# Altium footprint library Zmod.PcbLib: 229 footprints (part 9 of 15)
Each footprint in its own frame and in the unit in brackets; x right, y up, seen from the top. Pads: shape width x height; smd on the part's side, far side on the other; paste and mask are expansions set on the pad; w line width, h text height; cw(c..) or ccw(c..) is an arc to the next point about the centre after c.
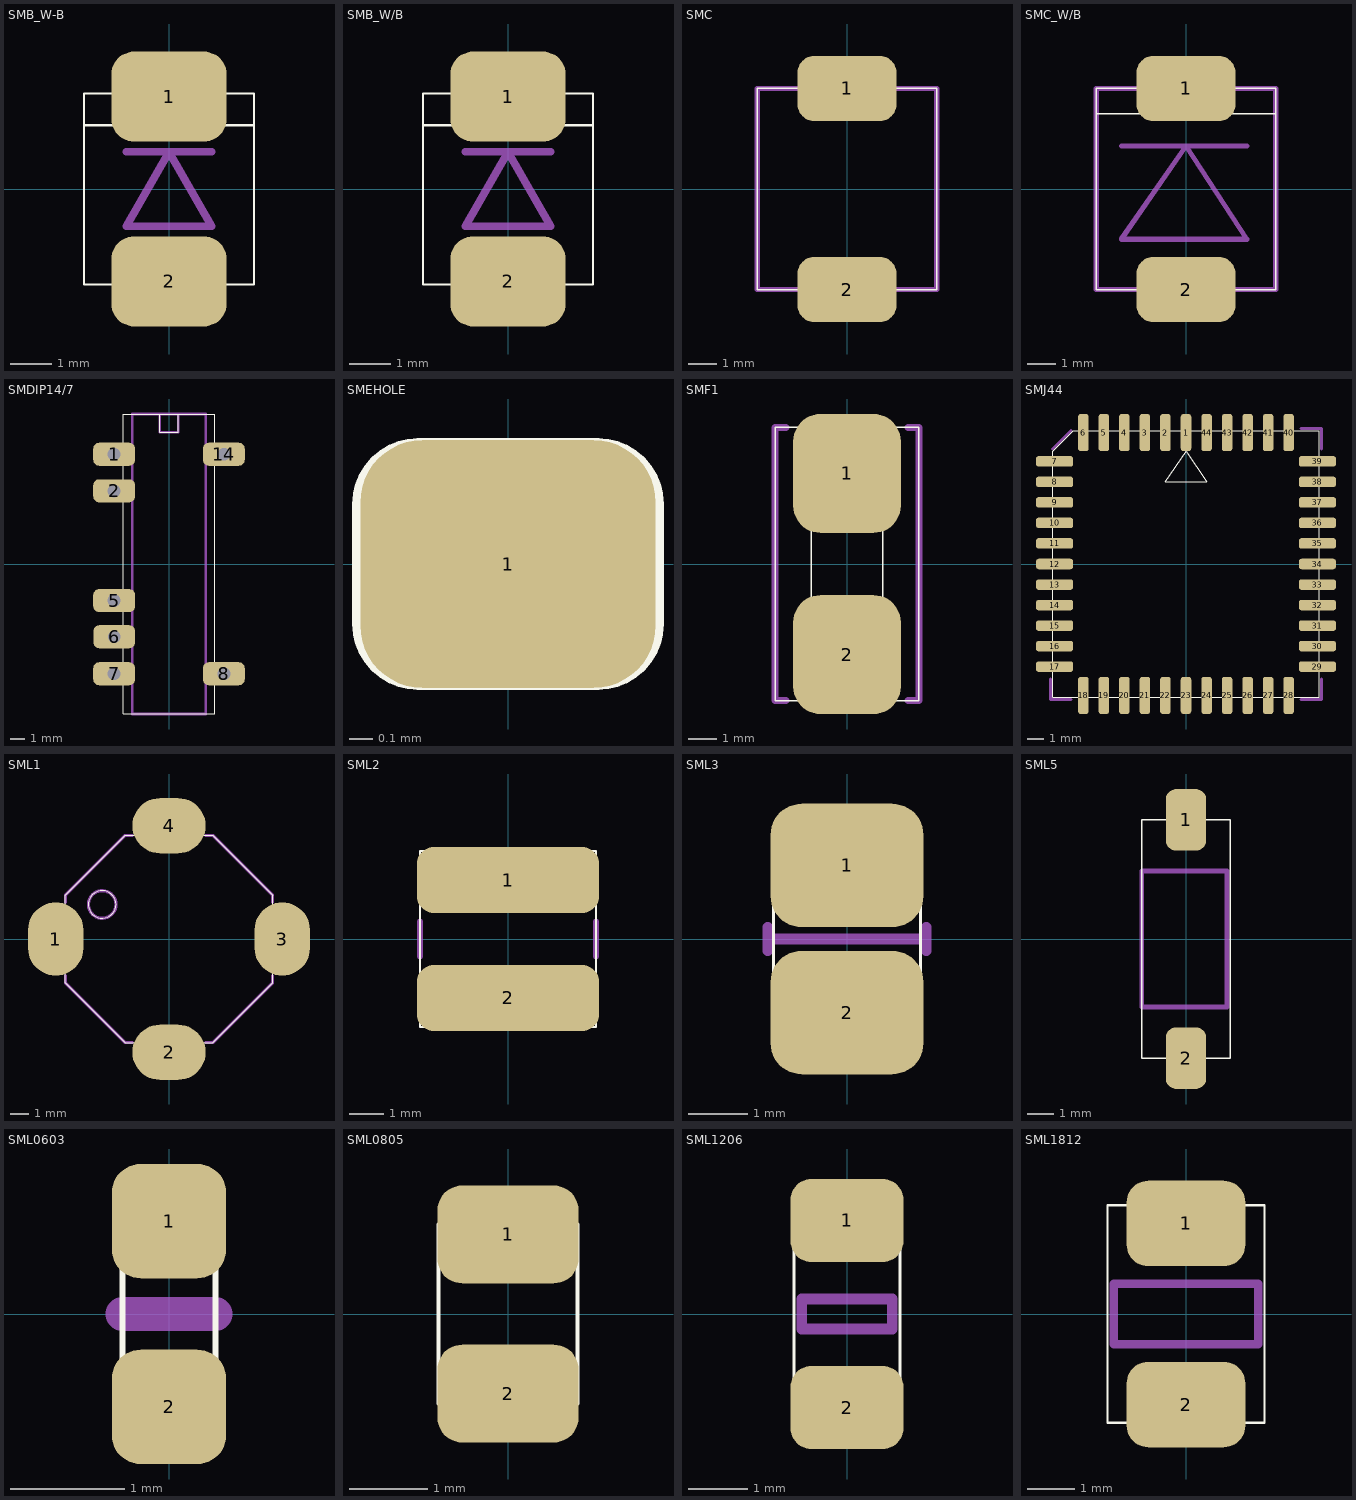
[diagram p8: the footprints below, top view; thin cyan lines are the x and y axes]

## SMB_W-B [mm] "DO-214AA With Band, Rev. 1"
height 2.54
pads (2):
  rrect50% 2.75x2.15 smd: 1(0,2.21) 2(0,-2.21)
Top Overlay:
  lines w0.05: -2.032,1.524 2.032,1.524 ; -1.016,-2.286 -1.016,-2.794 1.016,-2.794 1.016,-2.286 ; -1.016,2.286 -1.016,2.794 1.016,2.794 1.016,2.286 ; -2.032,-2.286 -2.032,2.286 2.032,2.286 2.032,-2.286 -2.032,-2.286
Mechanical 15:
  lines w0.18: -1.016,0.889 1.016,0.889 ; -1.016,-0.889 1.016,-0.889 0,0.889 -1.016,-0.889
  text ".Designator" at -0.254,-2.286 h1.5

## SMB_W/B [mm] "DO-214AA With Band"
height 2.54
pads (2):
  rrect50% 2.75x2.15 smd: 1(0,2.21) 2(0,-2.21)
Top Overlay:
  lines w0.05: -2.032,1.524 2.032,1.524 ; -1.016,-2.286 -1.016,-2.794 1.016,-2.794 1.016,-2.286 ; -1.016,2.286 -1.016,2.794 1.016,2.794 1.016,2.286 ; -2.032,-2.286 -2.032,2.286 2.032,2.286 2.032,-2.286 -2.032,-2.286
Mechanical 15:
  lines w0.18: -1.016,0.889 1.016,0.889 ; -1.016,-0.889 1.016,-0.889 0,0.889 -1.016,-0.889
  text ".Designator" at -0.254,-2.286 h1.5

## SMC [mm] "DO-214AB Without Band"
height 2.54
pads (2):
  rrect50% 3.5x2.3 smd: 1(0,3.556) 2(0,-3.556)
Top Overlay:
  lines w0.05: -1.524,-3.556 -1.524,-4.064 1.524,-4.064 1.524,-3.556 ; -1.524,3.556 -1.524,4.064 1.524,4.064 1.524,3.556 ; -3.175,-3.556 3.175,-3.556 3.175,3.556 -3.175,3.556 -3.175,-3.556
Mechanical 15:
  lines w0.18: -1.778,-3.556 -3.175,-3.556 -3.175,3.556 -1.778,3.556 ; 1.778,-3.556 3.175,-3.556 3.175,3.556 1.778,3.556
  text ".Designator" at -1.143,-3.429 h1.5

## SMC_W/B [mm] "DO-214AB With Band"
height 2.54
pads (2):
  rrect50% 3.5x2.3 smd: 1(0,3.556) 2(0,-3.556)
Top Overlay:
  lines w0.05: -3.175,2.667 3.175,2.667 ; -1.524,-3.556 -1.524,-4.064 1.524,-4.064 1.524,-3.556 ; -1.524,3.556 -1.524,4.064 1.524,4.064 1.524,3.556 ; -3.175,-3.556 -3.175,3.556 3.175,3.556 3.175,-3.556 -3.175,-3.556
Mechanical 15:
  lines w0.18: -2.286,1.524 2.159,1.524 ; -1.778,-3.556 -3.175,-3.556 -3.175,3.556 -1.778,3.556 ; 1.778,-3.556 3.175,-3.556 3.175,3.556 1.778,3.556 ; -2.286,-1.778 2.159,-1.778 0,1.524 -2.286,-1.778
  text ".Designator" at -1.524,-3.429 h1.5

## SMDIP14/7 [mm]
height 6.35
pads (7):
  rrect50% 2.9x1.6 / inner round 0.9 / far side round 1.6 hole 0.9: 1(-3.81,7.62) 2(-3.81,5.08) 5(-3.81,-2.54) 6(-3.8,-5.05) 7(-3.81,-7.62) 8(3.81,-7.62) 14(3.81,7.62)
Top Overlay:
  lines w0.05: -3.175,-8.255 -3.81,-8.255 -3.81,-6.985 -3.175,-6.985 ; -3.175,-5.715 -3.81,-5.715 -3.81,-4.445 -3.175,-4.445 ; -3.175,-3.175 -3.81,-3.175 -3.81,-1.905 -3.175,-1.905 ; -3.175,4.445 -3.81,4.445 -3.81,5.715 -3.175,5.715 ; -3.175,6.985 -3.81,6.985 -3.81,8.255 -3.175,8.255 ; -0.635,10.414 -0.635,9.144 0.635,9.144 0.635,10.414 ; 3.175,-8.255 3.81,-8.255 3.81,-6.985 3.175,-6.985 ; 3.175,6.985 3.81,6.985 3.81,8.255 3.175,8.255 ; -3.175,-10.414 -3.175,10.414 3.175,10.414 3.175,-10.414 -3.175,-10.414
Mechanical 15:
  lines w0.18: -0.635,10.414 -0.635,9.144 0.635,9.144 0.635,10.414 ; -2.54,-10.414 2.54,-10.414 2.54,10.414 -2.54,10.414 -2.54,-10.414
  text ".Designator" at -0.85,-7.45 h1.5

## SMEHOLE [mm]
pads (1):
  rrect50% 1.25x1.05 smd: 1(0,0)
Top Overlay:
  lines w0.05: -0.635,-0.254 ccw(c-0.381,-0.254) -0.381,-0.508 0.381,-0.508 ccw(c0.381,-0.254) 0.635,-0.254 0.635,0.254 ccw(c0.381,0.254) 0.381,0.508 -0.381,0.508 ccw(c-0.381,0.254) -0.635,0.254 -0.635,-0.254
Mechanical 15:
  text ".Designator" at -0.762,0.254 h1.5

## SMF1 [mm]
pads (2):
  rrect50% 3.8x4.2 smd: 1(0,3.2) 2(0,-3.2)
Top Overlay:
  lines w0.05: -1.27,-4.826 -1.27,-5.08 1.27,-5.08 1.27,-4.826 ; -1.27,-1.778 -1.27,1.778 ; -1.27,4.826 -1.27,5.08 1.27,5.08 1.27,4.826 ; -0.381,-3.175 -0.381,-3.048 ; -0.381,3.048 -0.381,3.175 ; 0.381,-3.175 0.381,-3.048 ; 0.381,3.048 0.381,3.175 ; 1.27,-1.778 1.27,1.778 ; -1.397,-3.048 1.397,-3.048 ; -1.397,-3.048 -1.397,-1.778 1.397,-1.778 1.397,-3.048 ; -1.397,-3.048 -1.397,-4.191 -0.762,-4.191 -0.762,-3.175 0.762,-3.175 0.762,-4.191 1.397,-4.191 1.397,-3.048 ; -1.397,3.048 1.397,3.048 ; -1.397,3.048 -1.397,1.778 -1.27,1.778 ; -1.397,3.048 -1.397,4.191 -0.762,4.191 -0.762,3.175 0.762,3.175 0.762,4.191 1.397,4.191 1.397,3.048 ; -1.27,1.778 1.397,1.778 1.397,3.048 ; -2.54,-4.826 -2.54,4.826 2.54,4.826 2.54,-4.826 -2.54,-4.826
Mechanical 15:
  lines w0.25: -2.159,-4.826 -2.54,-4.826 -2.54,4.826 -2.159,4.826 ; 2.159,-4.826 2.54,-4.826 2.54,4.826 2.159,4.826
  text ".Designator" at -0.762,-4.699 h1.5

## SMJ44 [mm]
height 4.572
pads (44):
  rrect50% 0.65x2.3 smd paste+0: 1(0,8.128) 2(-1.27,8.128) 3(-2.54,8.128) 4(-3.81,8.128) 5(-5.08,8.128) 6(-6.35,8.128) 18(-6.35,-8.128) 19(-5.08,-8.128) 20(-3.81,-8.128) 21(-2.54,-8.128) 22(-1.27,-8.128) 23(0,-8.128) 24(1.27,-8.128) 25(2.54,-8.128) 26(3.81,-8.128) 27(5.08,-8.128) 28(6.35,-8.128) 40(6.35,8.128) 41(5.08,8.128) 42(3.81,8.128) 43(2.54,8.128) 44(1.27,8.128)
  rrect50% 2.3x0.65 smd paste+0: 7(-8.128,6.35) 8(-8.128,5.08) 9(-8.128,3.81) 10(-8.128,2.54) 11(-8.128,1.27) 12(-8.128,0) 13(-8.128,-1.27) 14(-8.128,-2.54) 15(-8.128,-3.81) 16(-8.128,-5.08) 17(-8.128,-6.35) 29(8.128,-6.35) 30(8.128,-5.08) 31(8.128,-3.81) 32(8.128,-2.54) 33(8.128,-1.27) 34(8.128,0) 35(8.128,1.27) 36(8.128,2.54) 37(8.128,3.81) 38(8.128,5.08) 39(8.128,6.35)
Top Overlay:
  lines w0.05: -8.255,-8.255 -8.255,6.985 -6.985,8.255 8.255,8.255 8.255,-8.255 -8.255,-8.255 ; -1.27,5.08 0,6.985 1.27,5.08 -1.27,5.08
Mechanical 15:
  lines w0.18: -8.382,-7.112 -8.382,-8.382 -7.112,-8.382 ; -8.255,7.112 -7.112,8.255 ; 7.112,-8.382 8.382,-8.382 8.382,-7.112 ; 7.112,8.382 8.382,8.382 8.382,7.112
  text ".Designator" at -6.223,5.08 h1.5

## SML1 [mm]
height 6.35
pads (4):
  oval 3.05x4.05 smd: 1(-6.248,0) 3(6.248,0)
  oval 4.05x3.05 smd: 2(0,-6.248) 4(0,6.248)
Top Overlay:
  circle w0.05: c-3.683,1.905 r0.762
  lines w0.05: -5.715,-1.27 -6.985,-1.27 -6.985,1.27 -5.715,1.27 ; -1.27,-5.715 -1.27,-6.985 1.27,-6.985 1.27,-5.715 ; -1.27,5.715 -1.27,6.985 1.27,6.985 1.27,5.715 ; 5.715,-1.27 6.985,-1.27 6.985,1.27 5.715,1.27 ; -5.715,-2.413 -5.715,2.413 -2.413,5.715 2.413,5.715 5.715,2.413 5.715,-2.413 2.413,-5.715 -2.413,-5.715 -5.715,-2.413
Mechanical 15:
  circle w0.18: c-3.683,1.905 r0.762
  lines w0.18: -5.715,-2.032 -5.715,-2.413 -2.413,-5.715 -2.032,-5.715 ; -5.715,2.032 -5.715,2.413 -2.413,5.715 -2.032,5.715 ; 2.032,-5.715 2.413,-5.715 5.715,-2.413 5.715,-2.032 ; 2.032,5.715 2.413,5.715 5.715,2.413 5.715,2.032
  text ".Designator" at -4.318,-0.635 h1.5

## SML2 [mm]
height 3.048
pads (2):
  rrect50% 5.25x1.9 smd: 1(0,1.702) 2(0,-1.702)
Top Overlay:
  lines w0.05: -2.54,-2.54 2.54,-2.54 2.54,2.54 -2.54,2.54 -2.54,-2.54
Mechanical 15:
  lines w0.18: -2.54,-0.508 -2.54,0.508 ; 2.54,-0.508 2.54,0.508
  text ".Designator" at 0.254,-2.159 h1.5

## SML3 [mm]
height 1.778
pads (2):
  rrect50% 2.6x2.1 smd: 1(0,1.25) 2(0,-1.25)
Top Overlay:
  lines w0.05: -1.25,-1.6 1.25,-1.6 1.25,1.6 -1.25,1.6 -1.25,-1.6
Mechanical 15:
  lines w0.18: -1.35,-0.2 -1.35,0.2 ; -1.35,0 1.35,0 ; 1.35,-0.2 1.35,0.2
  text ".Designator" at 0.508,-2.032 h1.5

## SML5 [mm]
height 2.921
pads (2):
  rrect50% 1.5x2.3 smd: 1(0,4.445) 2(0,-4.445)
Top Overlay:
  lines w0.05: -1.651,-4.445 -1.651,4.445 1.651,4.445 1.651,-4.445 -1.651,-4.445
Mechanical 15:
  lines w0.18: -1.651,-2.54 -1.651,2.54 1.524,2.54 1.524,-2.54 -1.651,-2.54
  text ".Designator" at 0.381,-4.572 h1.5

## SML0603 [mm]
height 0.889
pads (2):
  rrect50% 1x1 smd: 1(0,0.813) 2(0,-0.813)
Top Overlay:
  lines w0.05: -0.406,-0.813 0.406,-0.813 0.406,0.813 -0.406,0.813 -0.406,-0.813
Mechanical 15:
  lines w0.3: -0.406,0 0.406,0
  text ".Designator" at 0.381,-1.27 h1.5

## SML0805 [mm]
height 1.524
pads (2):
  rrect50% 1.8x1.25 smd: 1(0,1.016) 2(0,-1.016)
Top Overlay:
  lines w0.05: -0.889,-1.143 -0.889,1.143 0.889,1.143 0.889,-1.143 -0.889,-1.143
Mechanical 15:
  text ".Designator" at 0.635,-1.397 h1.5

## SML1206 [mm]
height 1.143
pads (2):
  rrect50% 1.9x1.4 smd: 1(0,1.575) 2(0,-1.575)
Top Overlay:
  lines w0.05: -0.889,-1.651 0.889,-1.651 0.889,1.651 -0.889,1.651 -0.889,-1.651
Mechanical 15:
  lines w0.18: -0.762,-0.254 0.762,-0.254 0.762,0.254 -0.762,0.254 -0.762,-0.254
  text ".Designator" at 0.508,-1.905 h1.5

## SML1812 [mm]
height 3.81
pads (2):
  rrect50% 2.5x1.8 smd: 1(0,1.905) 2(0,-1.905)
Top Overlay:
  lines w0.05: -1.651,-2.286 1.651,-2.286 1.651,2.286 -1.651,2.286 -1.651,-2.286
Mechanical 15:
  lines w0.18: -1.524,-0.635 1.524,-0.635 1.524,0.635 -1.524,0.635 -1.524,-0.635
  text ".Designator" at 0.762,-2.286 h1.5